# Altium schematic symbol library FPGA_Xilinx_Virtex5.SchLib: 41 symbols (part 25 of 27) (continued)
## XC5VTX150T-FF1156 (continued)

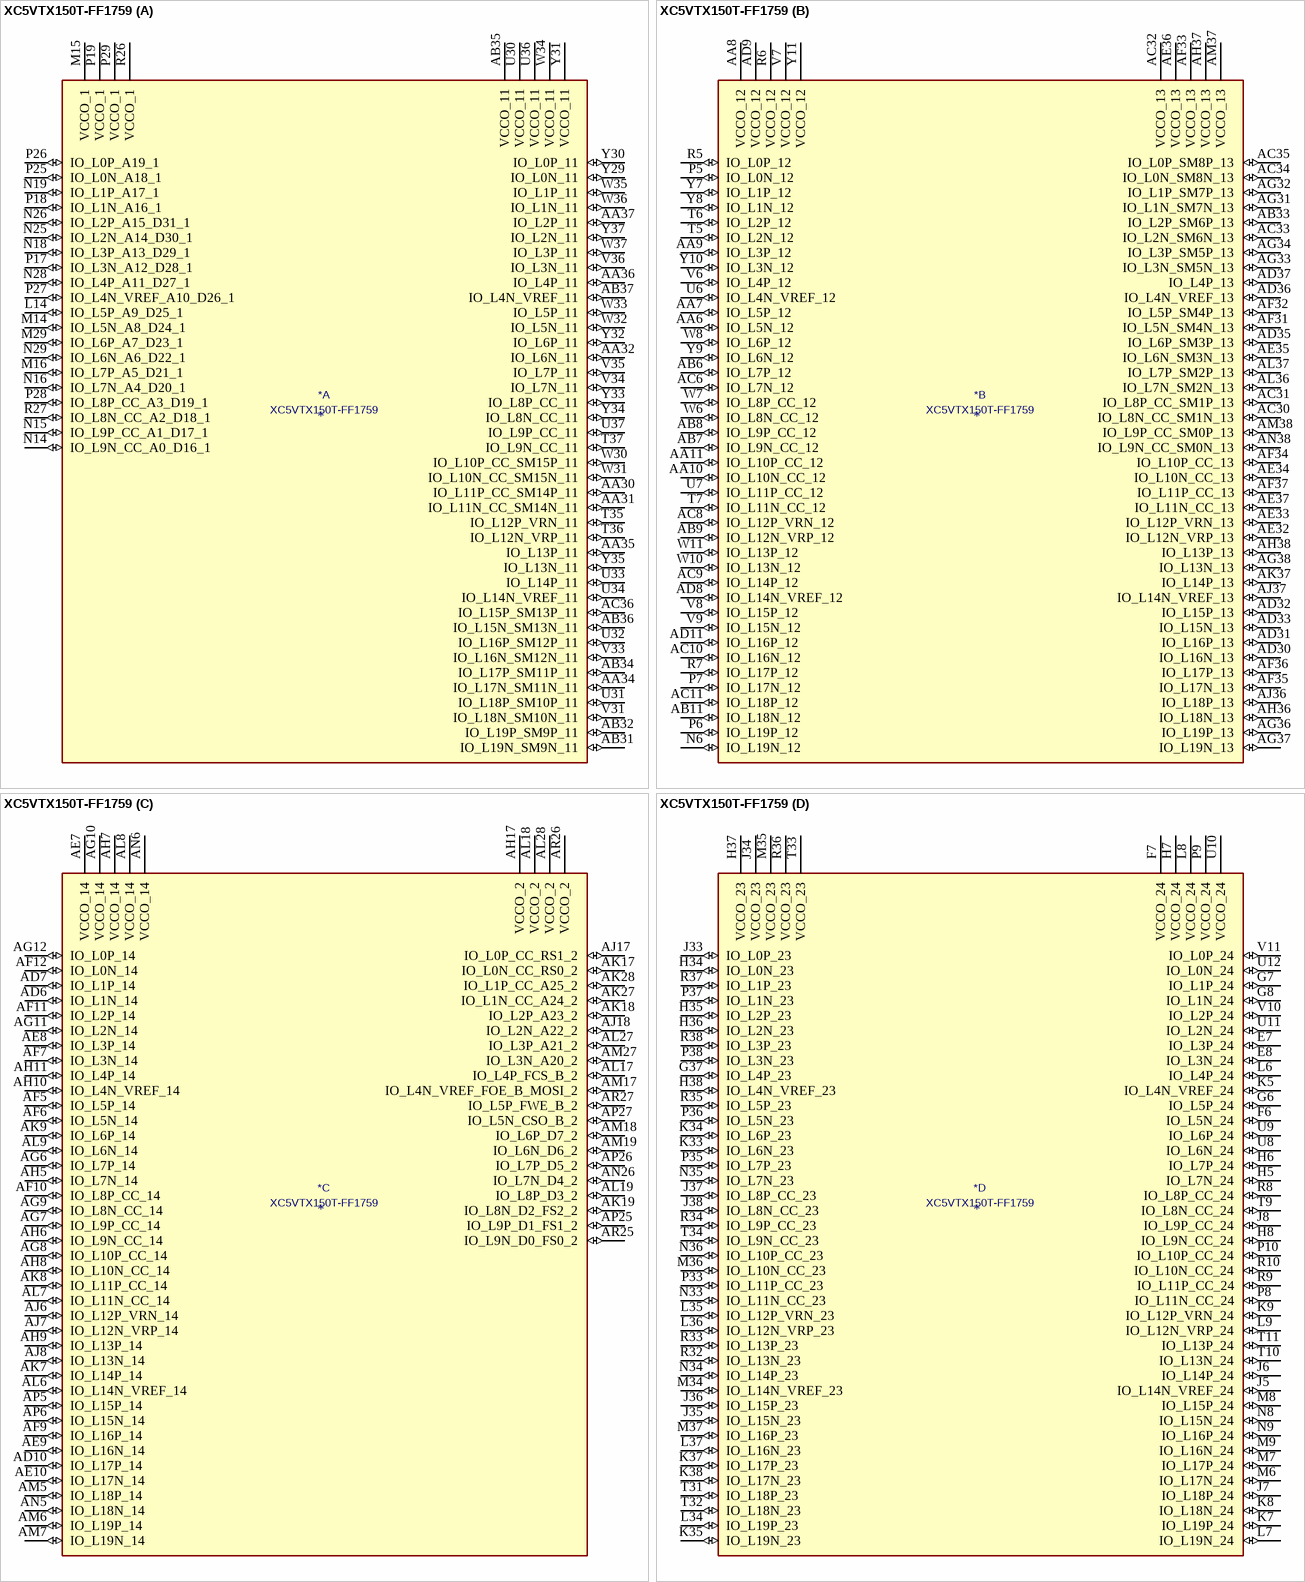
[diagram p129: symbol XC5VTX150T-FF1759]

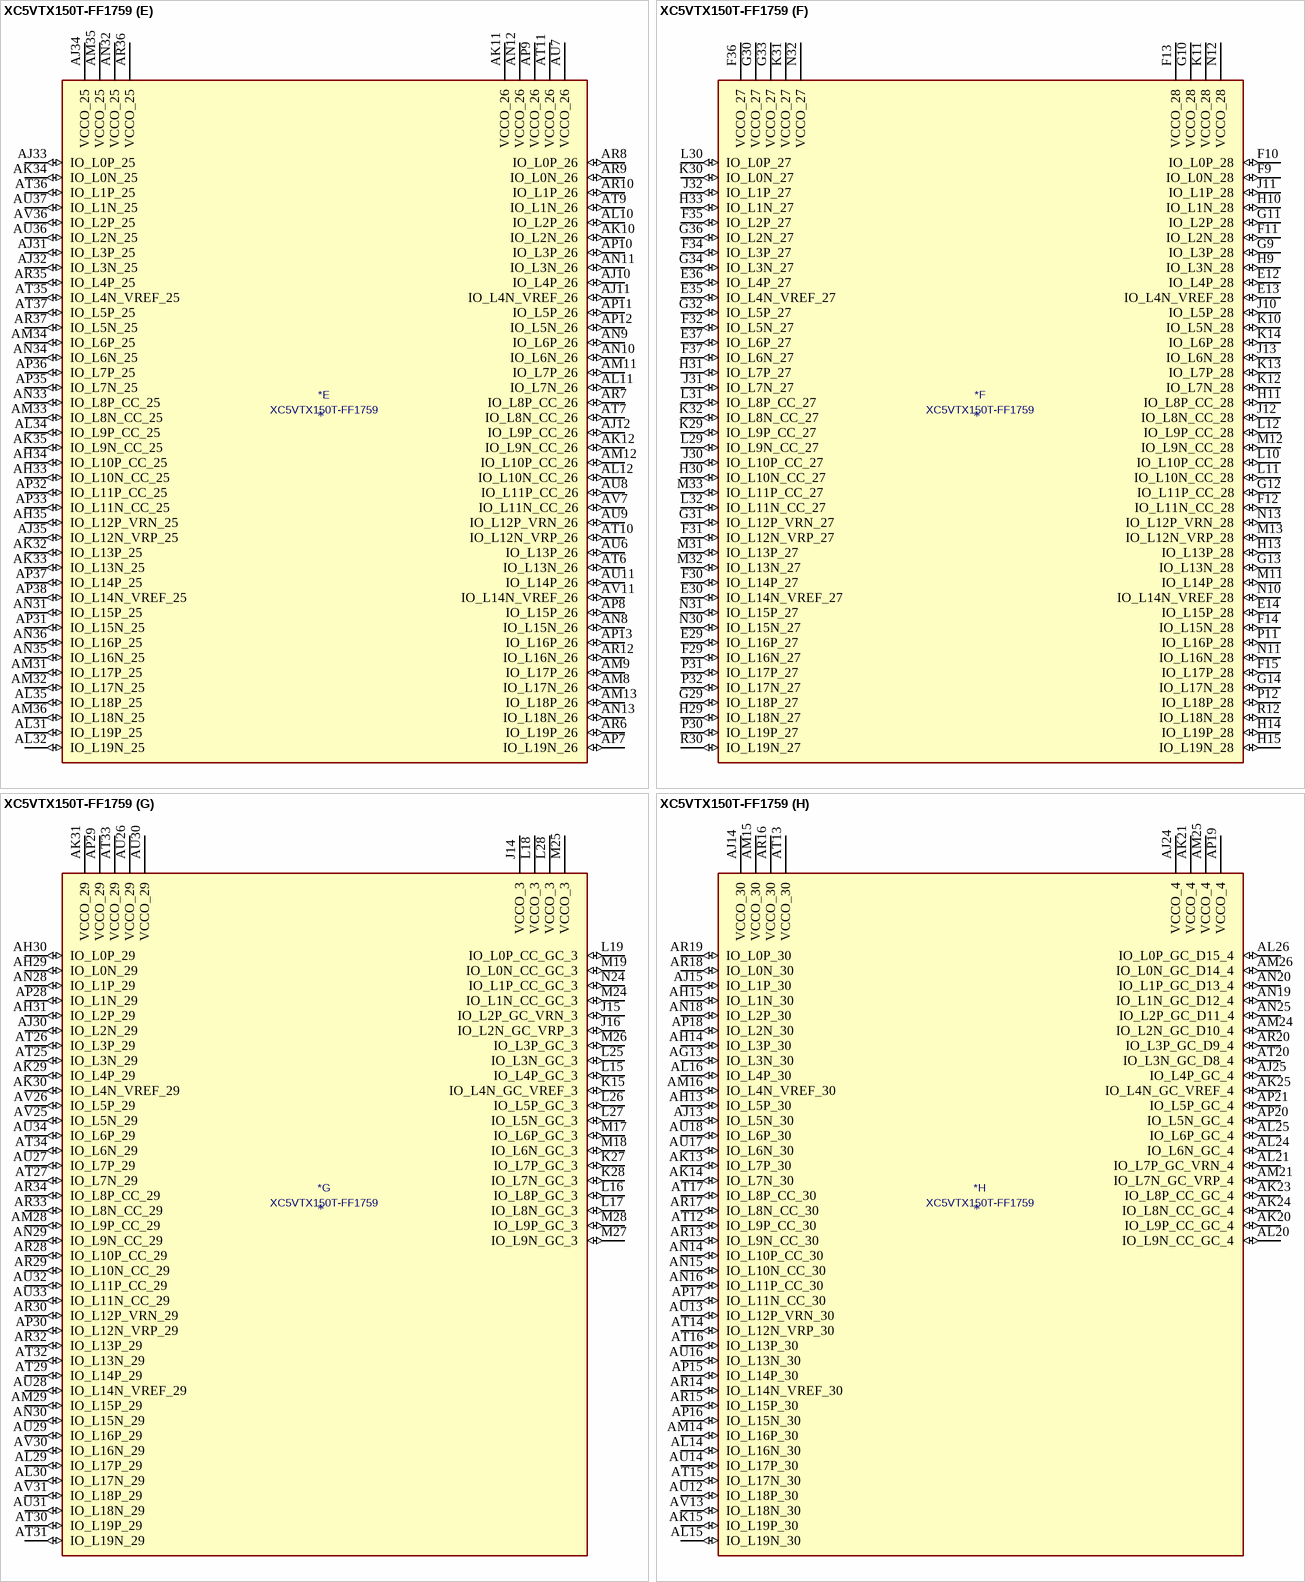
[diagram p130: symbol XC5VTX150T-FF1759]

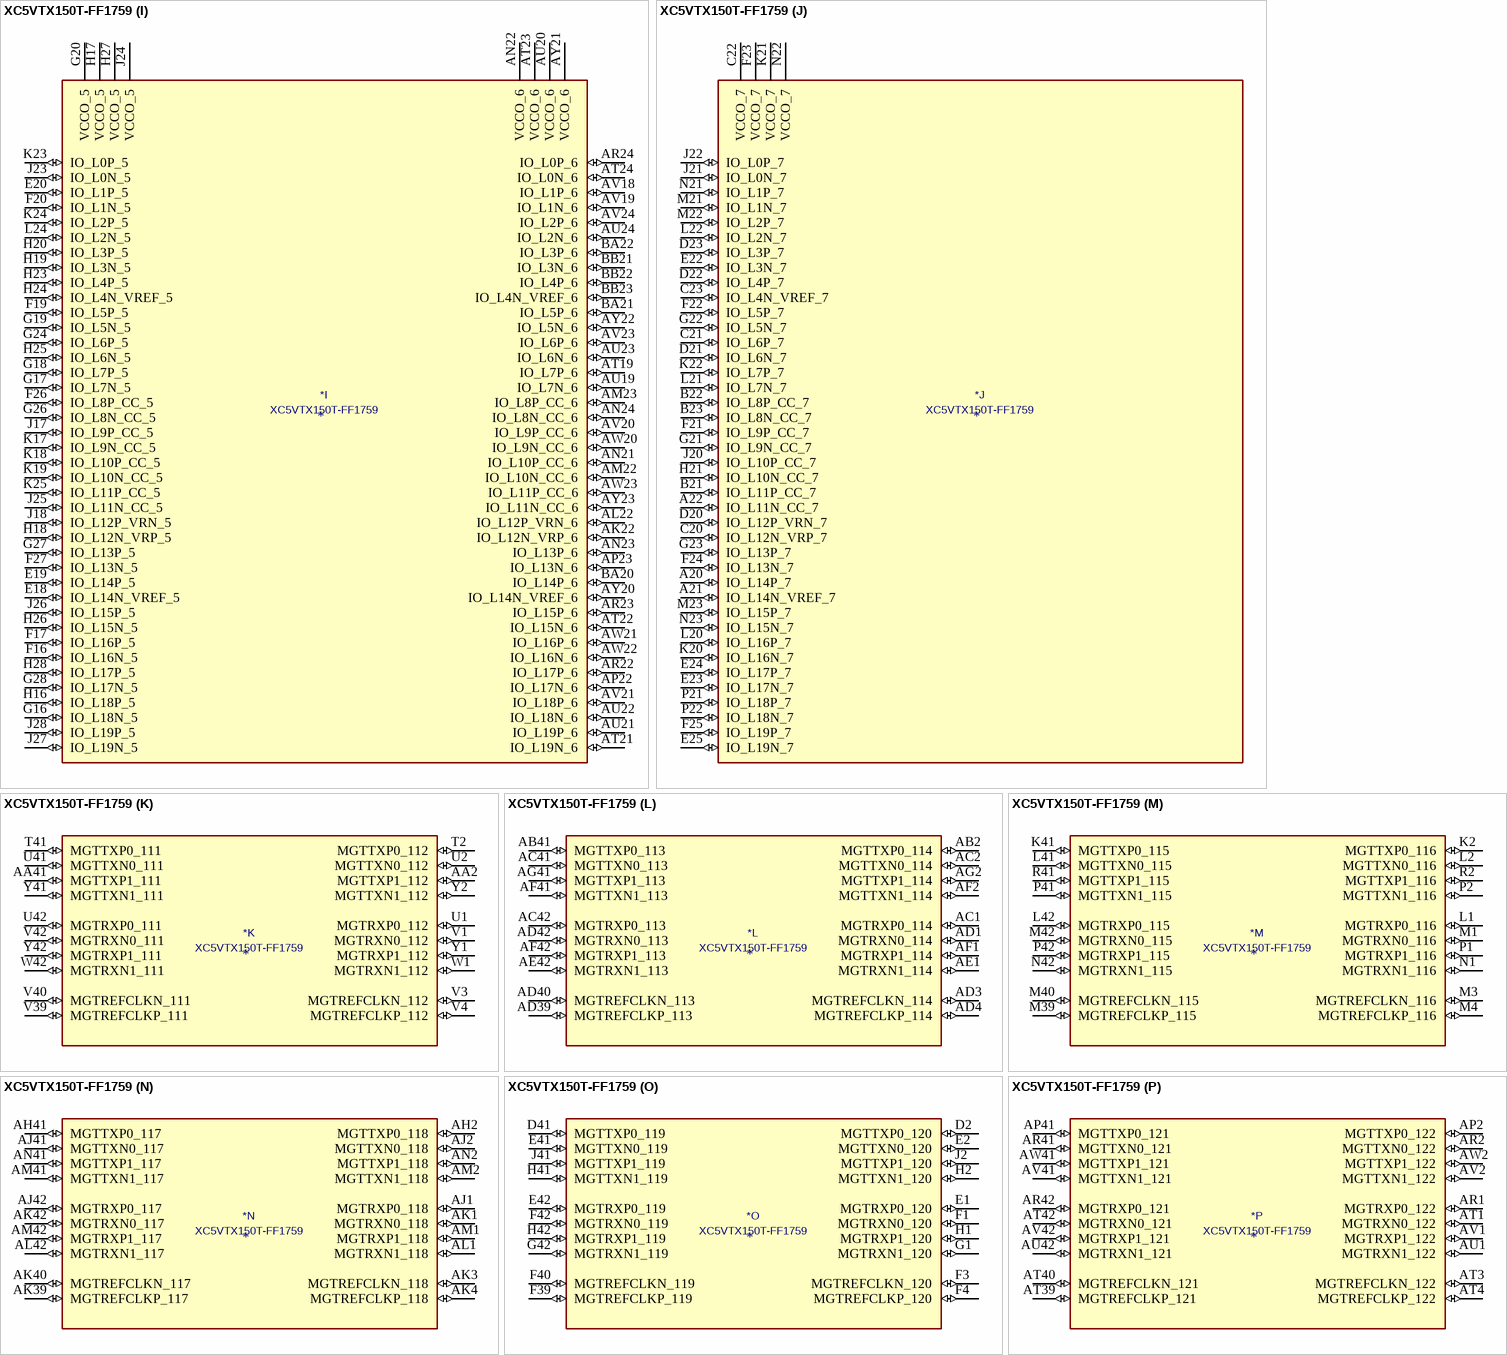
[diagram p131: symbol XC5VTX150T-FF1759]

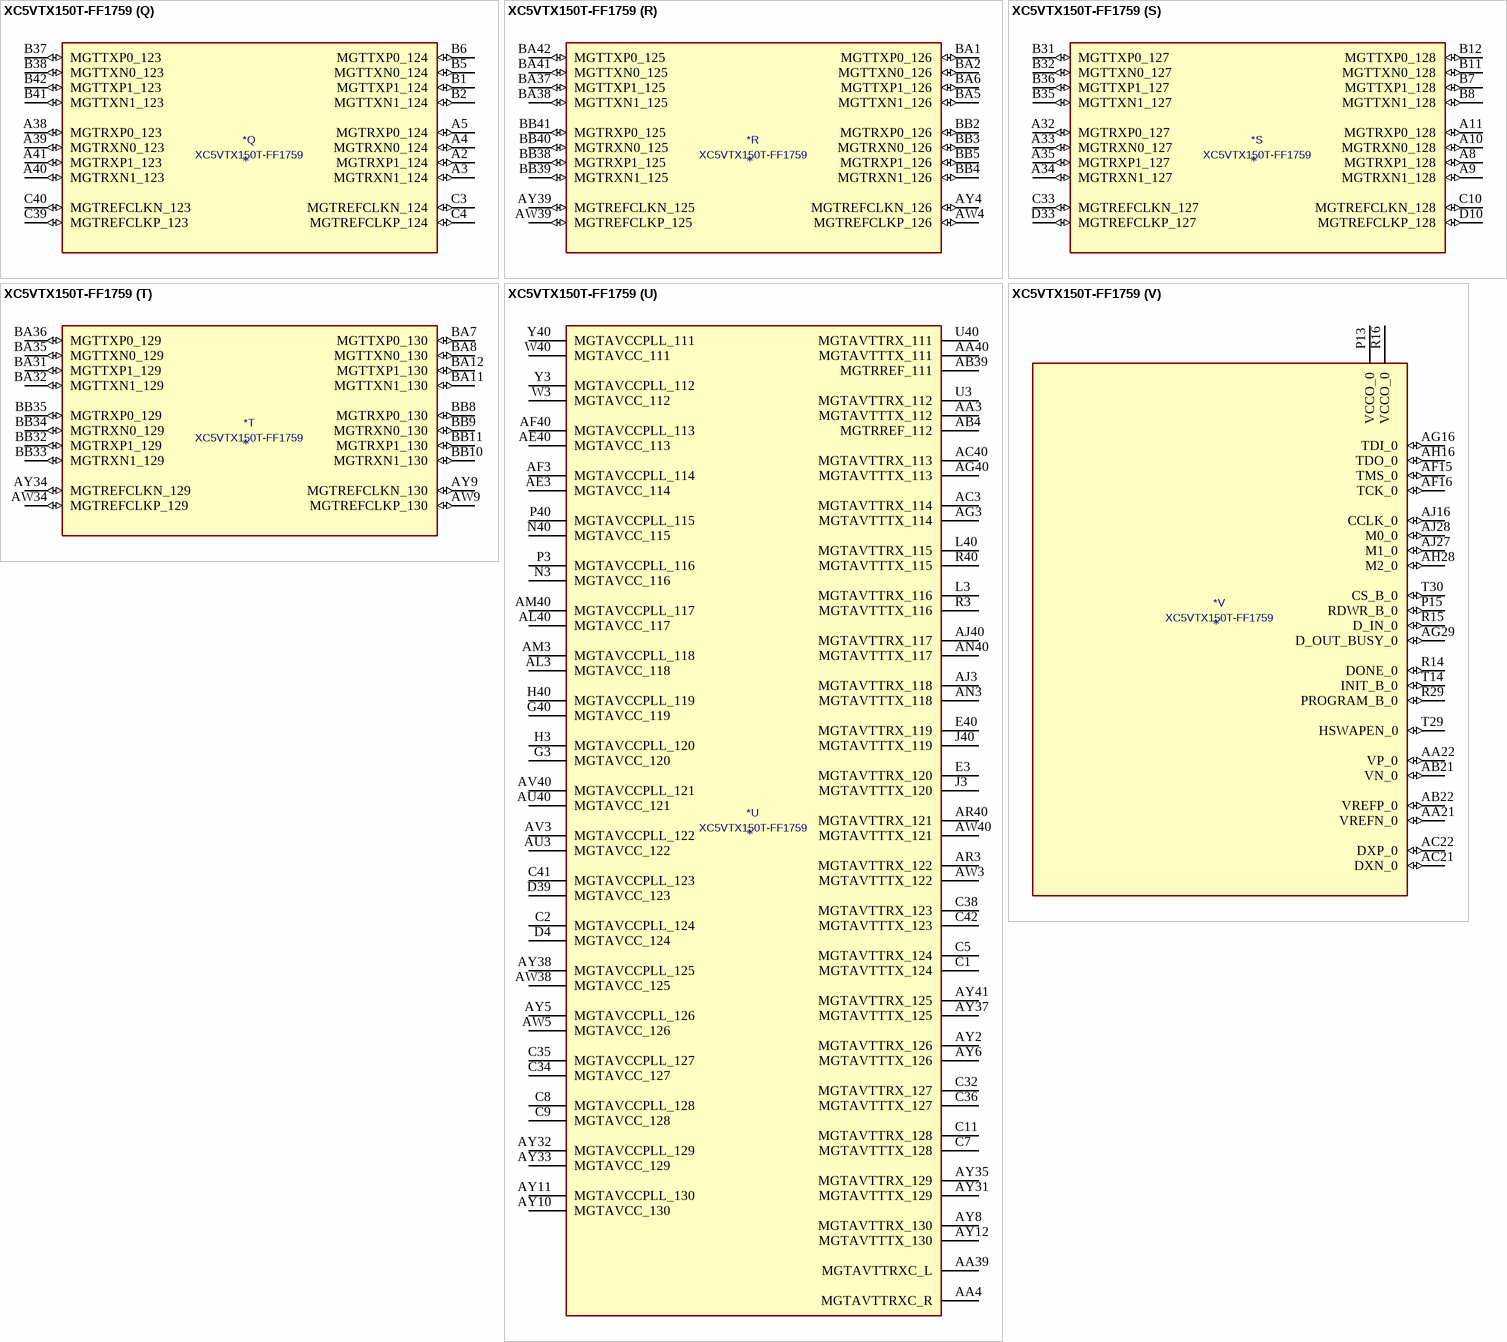
[diagram p132: symbol XC5VTX150T-FF1759]

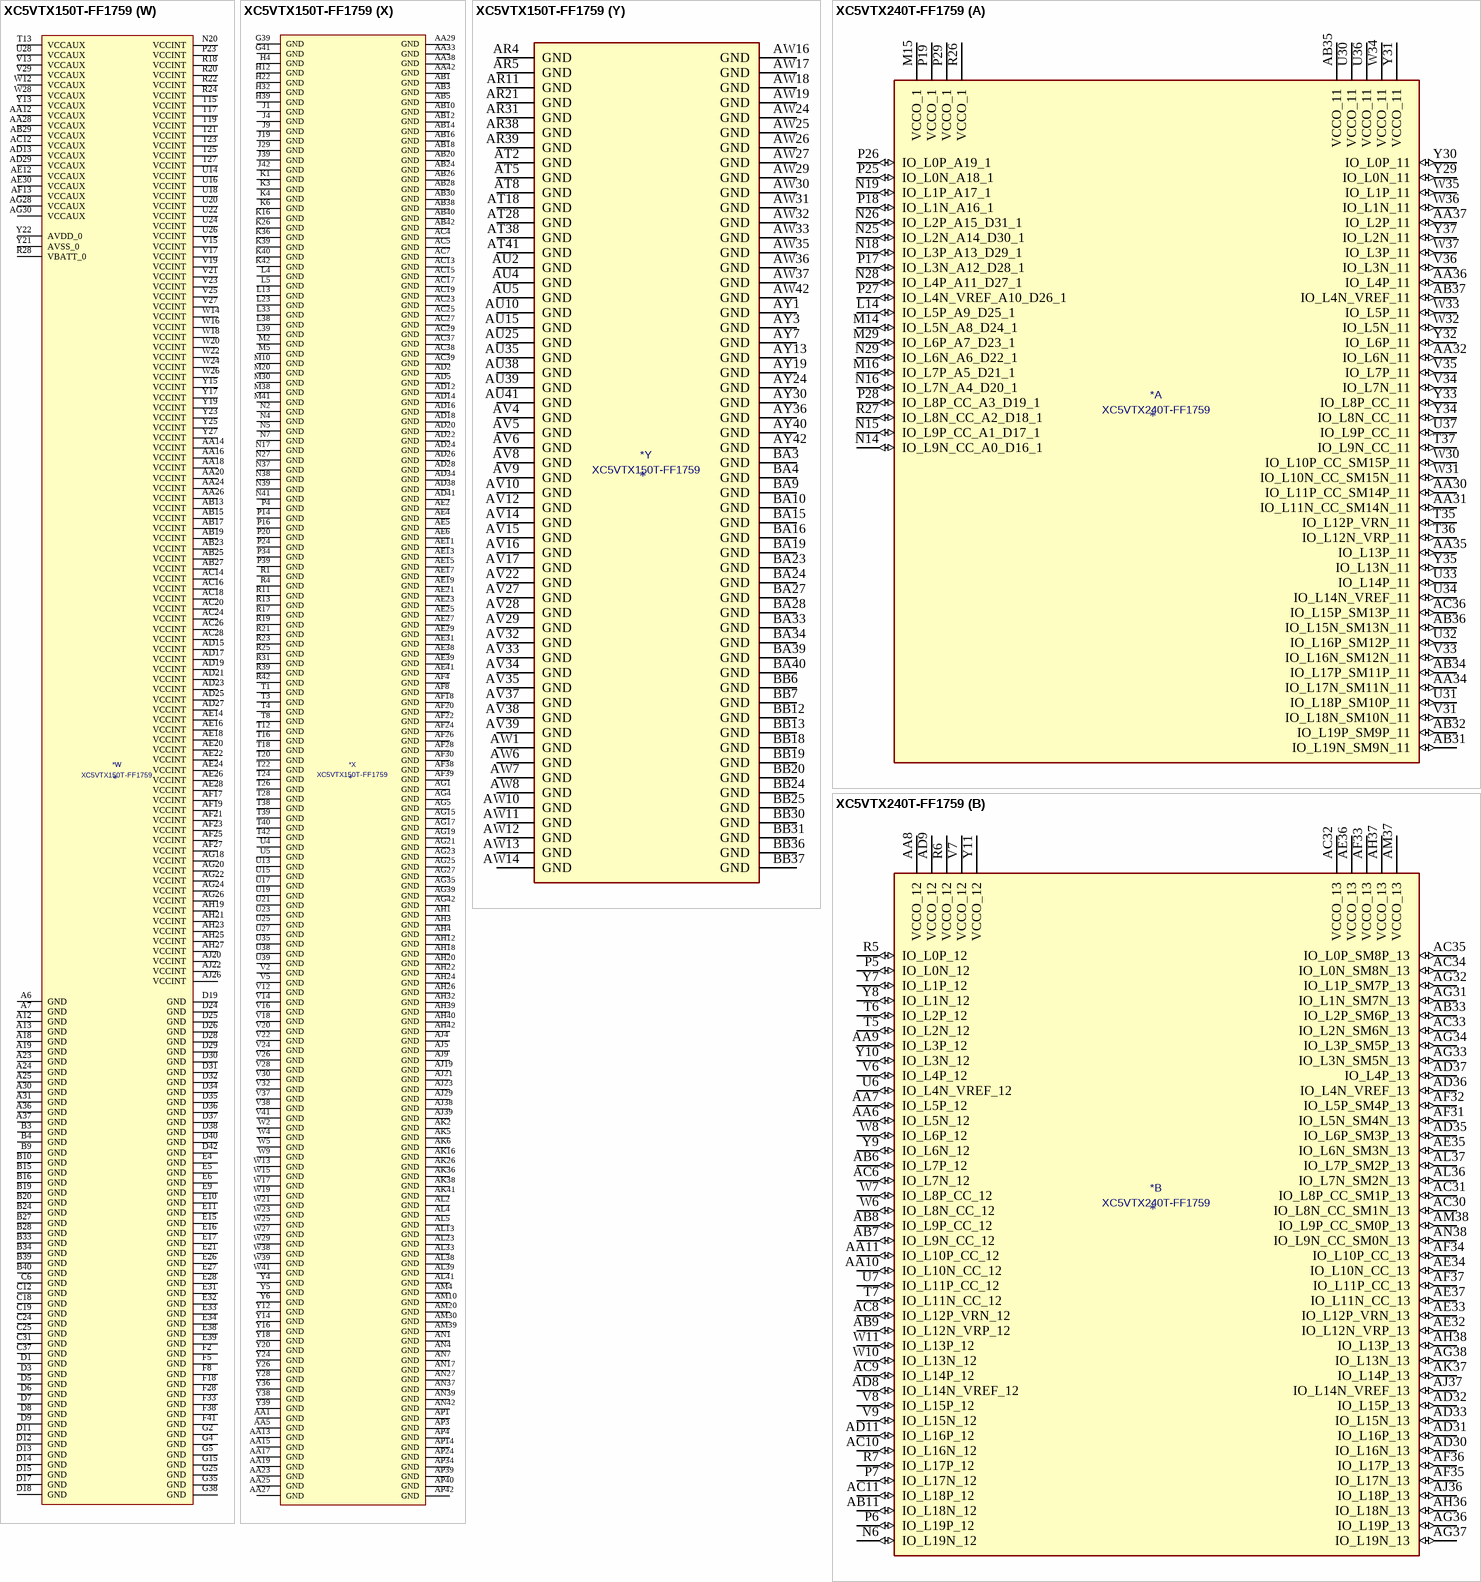
[diagram p133: symbols XC5VTX150T-FF1759 to XC5VTX240T-FF1759]